# Altium footprint library 691 307 300 0xx.PcbLib: 23 footprints (part 1 of 2)
Each footprint in its own frame and in the unit in brackets; x right, y up, seen from the top. Pads: shape width x height; smd on the part's side, far side on the other; paste and mask are expansions set on the pad; w line width, h text height; cw(c..) or ccw(c..) is an arc to the next point about the centre after c.
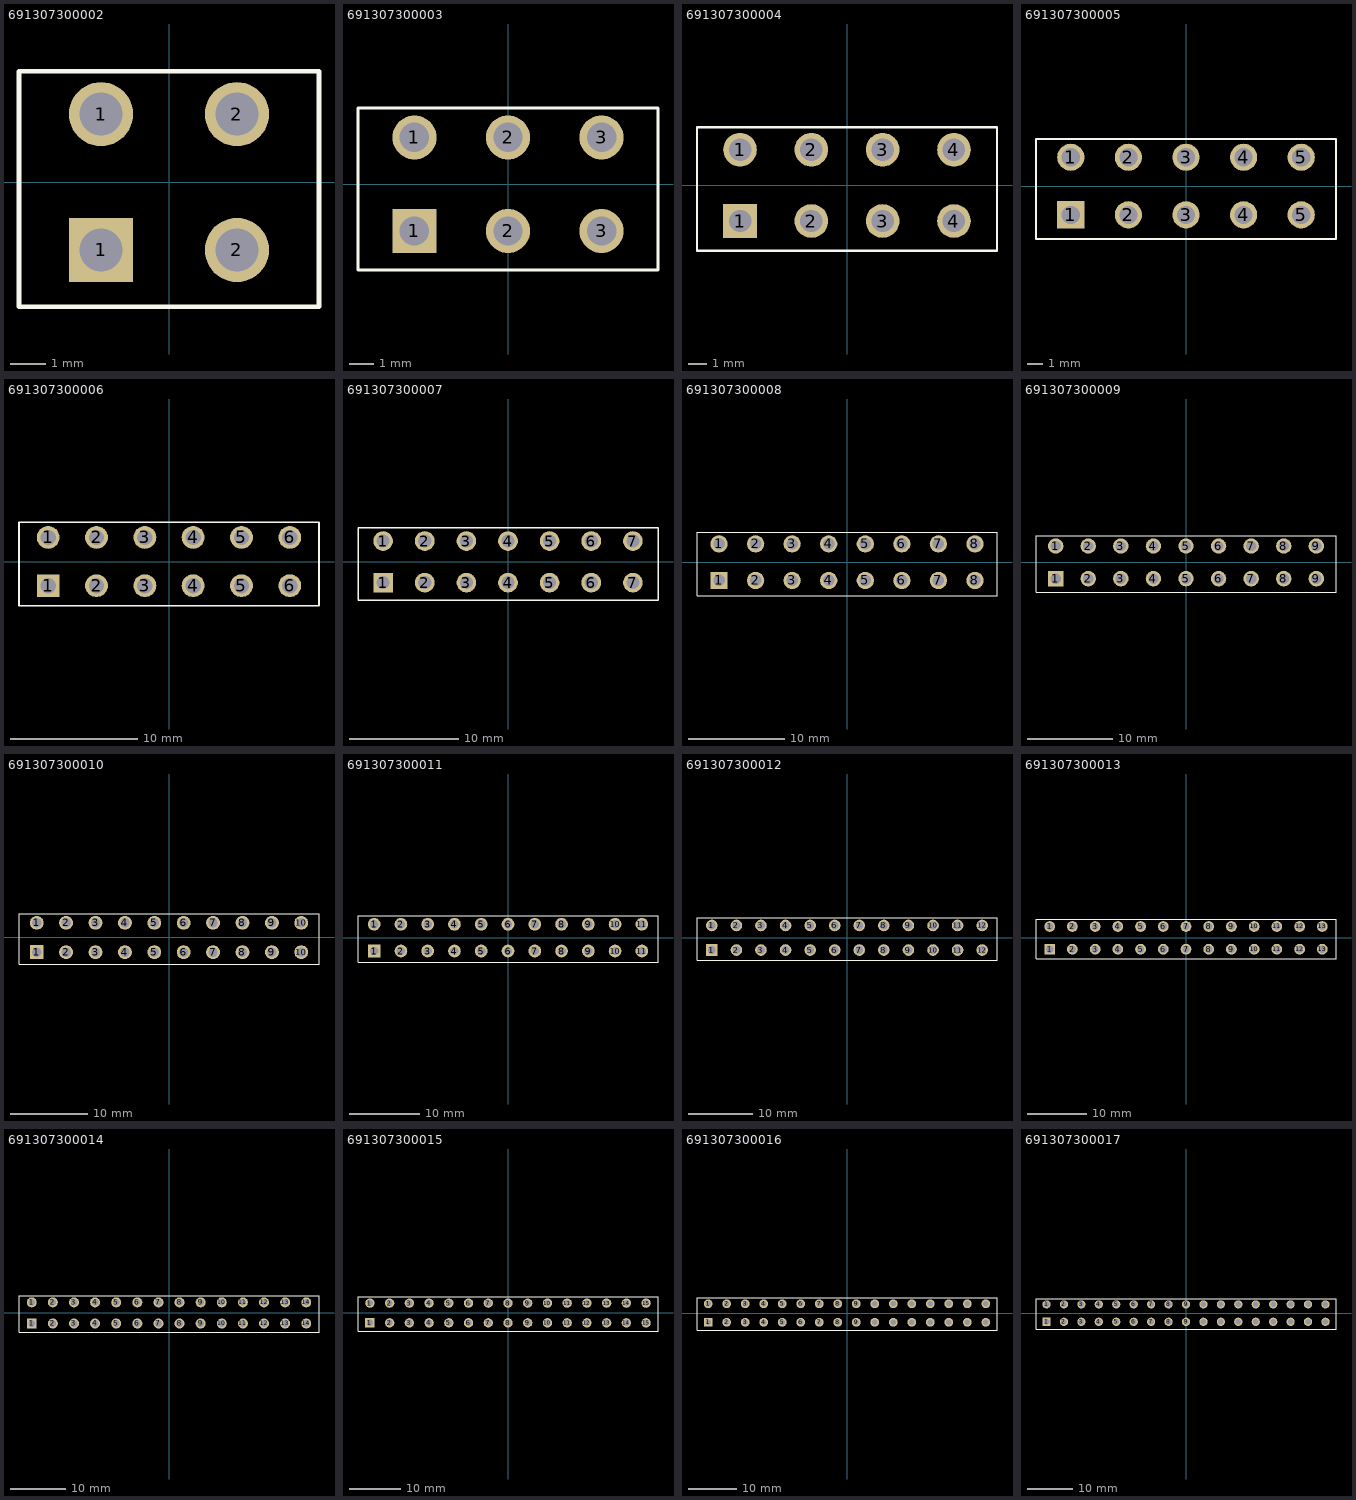
[diagram p0: the footprints below, top view; thin cyan lines are the x and y axes]

## 691307300002 [mm] "Serie 3073 - 3.81 mm _ 2 pins"
height 14.5
pads (4):
  rect 1.8x1.8 hole 1.2: 1(-1.905,-1.905)
  round 1.8 hole 1.2: 1(-1.905,1.905) 2(1.905,-1.905) 2(1.905,1.905)
Top Overlay:
  lines w0.127: -4.205,-3.495 -4.205,3.105 4.205,3.105 4.205,-3.495 -4.205,-3.495
3D body: height 14.55, standoff -3.35, extent -4.205,-3.6 4.205,3.2

## 691307300003 [mm] "Serie 3073 - 3.81 mm _ 3 pins"
height 14.5
pads (6):
  rect 1.8x1.8 hole 1.2: 1(-3.81,-1.905)
  round 1.8 hole 1.2: 1(-3.81,1.905) 2(0,-1.905) 2(0,1.905) 3(3.81,-1.905) 3(3.81,1.905)
Top Overlay:
  lines w0.127: -6.11,-3.495 -6.11,3.105 6.11,3.105 6.11,-3.495 -6.11,-3.495
3D body: height 14.55, standoff -3.35, extent -6.11,-3.6 6.11,3.2

## 691307300004 [mm] "Serie 3073 - 3.81 mm _ 4 pins"
height 14.5
pads (8):
  rect 1.8x1.8 hole 1.2: 1(-5.715,-1.905)
  round 1.8 hole 1.2: 1(-5.715,1.905) 2(-1.905,-1.905) 2(-1.905,1.905) 3(1.905,-1.905) 3(1.905,1.905) 4(5.715,-1.905) 4(5.715,1.905)
Top Overlay:
  lines w0.127: -8.015,-3.495 -8.015,3.105 8.015,3.105 8.015,-3.495 -8.015,-3.495
3D body: height 14.55, standoff -3.35, extent -8.015,-3.6 8.015,3.2

## 691307300005 [mm] "Serie 3073 - 3.81 mm _ 5 pins"
height 14.5
pads (10):
  rect 1.8x1.8 hole 1.2: 1(-7.62,-1.905)
  round 1.8 hole 1.2: 1(-7.62,1.905) 2(-3.81,-1.905) 2(-3.81,1.905) 3(0,-1.905) 3(0,1.905) 4(3.81,-1.905) 4(3.81,1.905) 5(7.62,-1.905) 5(7.62,1.905)
Top Overlay:
  lines w0.127: -9.92,-3.495 9.92,-3.495 9.92,3.105 -9.92,3.105 -9.92,-3.495
3D body: height 14.55, standoff -3.35, extent -9.87,-3.5 9.97,3.3

## 691307300006 [mm] "Serie 3073 - 3.81 mm _ 6 pins"
height 14.5
pads (12):
  rect 1.8x1.8 hole 1.2: 1(-9.525,-1.905)
  round 1.8 hole 1.2: 1(-9.525,1.905) 2(-5.715,-1.905) 2(-5.715,1.905) 3(-1.905,-1.905) 3(-1.905,1.905) 4(1.905,-1.905) 4(1.905,1.905) 5(5.715,-1.905) 5(5.715,1.905) 6(9.525,-1.905) 6(9.525,1.905)
Top Overlay:
  lines w0.127: -11.825,-3.495 11.825,-3.495 11.825,3.105 -11.825,3.105 -11.825,-3.495
3D body: height 14.55, standoff -3.35, extent -11.825,-3.6 11.825,3.2

## 691307300007 [mm] "Serie 3073 - 3.81 mm _ 7 pins"
height 14.5
pads (14):
  rect 1.8x1.8 hole 1.2: 1(-11.43,-1.905)
  round 1.8 hole 1.2: 1(-11.43,1.905) 2(-7.62,-1.905) 2(-7.62,1.905) 3(-3.81,-1.905) 3(-3.81,1.905) 4(0,-1.905) 4(0,1.905) 5(3.81,-1.905) 5(3.81,1.905) 6(7.62,-1.905) 6(7.62,1.905) 7(11.43,-1.905) 7(11.43,1.905)
Top Overlay:
  lines w0.127: -13.73,-3.495 13.73,-3.495 13.73,3.105 -13.73,3.105 -13.73,-3.495
3D body: height 14.55, standoff -3.35, extent -13.7,-3.6 13.76,3.2

## 691307300008 [mm] "Serie 3073 - 3.81 mm _ 8 pins"
height 14.5
pads (16):
  rect 1.8x1.8 hole 1.2: 1(-13.335,-1.905)
  round 1.8 hole 1.2: 1(-13.335,1.905) 2(-9.525,-1.905) 2(-9.525,1.905) 3(-5.715,-1.905) 3(-5.715,1.905) 4(-1.905,-1.905) 4(-1.905,1.905) 5(1.905,-1.905) 5(1.905,1.905) 6(5.715,-1.905) 6(5.715,1.905) 7(9.525,-1.905) 7(9.525,1.905) 8(13.335,-1.905) 8(13.335,1.905)
Top Overlay:
  lines w0.127: -15.635,-3.495 -15.635,3.105 15.635,3.105 15.635,-3.495 -15.635,-3.495
3D body: height 14.55, standoff -3.35, extent -15.635,-3.6 15.635,3.2

## 691307300009 [mm] "Serie 3073 - 3.81 mm _ 9 pins"
height 14.5
pads (18):
  rect 1.8x1.8 hole 1.2: 1(-15.24,-1.905)
  round 1.8 hole 1.2: 1(-15.24,1.905) 2(-11.43,-1.905) 2(-11.43,1.905) 3(-7.62,-1.905) 3(-7.62,1.905) 4(-3.81,-1.905) 4(-3.81,1.905) 5(0,-1.905) 5(0,1.905) 6(3.81,-1.905) 6(3.81,1.905) 7(7.62,-1.905) 7(7.62,1.905) 8(11.43,-1.905) 8(11.43,1.905) 9(15.24,-1.905) 9(15.24,1.905)
Top Overlay:
  lines w0.127: -17.54,-3.495 -17.54,3.105 17.54,3.105 17.54,-3.495 -17.54,-3.495
3D body: height 14.55, standoff -3.35, extent -17.54,-3.5 17.54,3.3

## 691307300010 [mm] "Serie 3073 - 3.81 mm _ 10 pins"
height 14.5
pads (20):
  rect 1.8x1.8 hole 1.2: 1(-17.145,-1.905)
  round 1.8 hole 1.2: 1(-17.145,1.905) 2(-13.335,-1.905) 2(-13.335,1.905) 3(-9.525,-1.905) 3(-9.525,1.905) 4(-5.715,-1.905) 4(-5.715,1.905) 5(-1.905,-1.905) 5(-1.905,1.905) 6(1.905,-1.905) 6(1.905,1.905) 7(5.715,-1.905) 7(5.715,1.905) 8(9.525,-1.905) 8(9.525,1.905) 9(13.335,-1.905) 9(13.335,1.905) 10(17.145,-1.905) 10(17.145,1.905)
Top Overlay:
  lines w0.127: -19.445,-3.495 -19.445,3.105 19.445,3.105 19.445,-3.495 -19.445,-3.495
3D body: height 14.55, standoff -3.35, extent -19.4,-3.5 19.49,3.3

## 691307300011 [mm] "Serie 3073 - 3.81 mm _ 11 pins"
height 14.5
pads (22):
  rect 1.8x1.8 hole 1.2: 1(-19.05,-1.905)
  round 1.8 hole 1.2: 1(-19.05,1.905) 2(-15.24,-1.905) 2(-15.24,1.905) 3(-11.43,-1.905) 3(-11.43,1.905) 4(-7.62,-1.905) 4(-7.62,1.905) 5(-3.81,-1.905) 5(-3.81,1.905) 6(0,-1.905) 6(0,1.905) 7(3.81,-1.905) 7(3.81,1.905) 8(7.62,-1.905) 8(7.62,1.905) 9(11.43,-1.905) 9(11.43,1.905) 10(15.24,-1.905) 10(15.24,1.905) 11(19.05,-1.905) 11(19.05,1.905)
Top Overlay:
  lines w0.127: -21.35,-3.495 -21.35,3.105 21.35,3.105 21.35,-3.495 -21.35,-3.495
3D body: height 14.55, standoff -3.35, extent -21.3,-3.5 21.4,3.3

## 691307300012 [mm] "Serie 3073 - 3.81 mm _ 12 pins"
height 14.5
pads (24):
  rect 1.8x1.8 hole 1.2: 1(-20.955,-1.905)
  round 1.8 hole 1.2: 1(-20.955,1.905) 2(-17.145,-1.905) 2(-17.145,1.905) 3(-13.335,-1.905) 3(-13.335,1.905) 4(-9.525,-1.905) 4(-9.525,1.905) 5(-5.715,-1.905) 5(-5.715,1.905) 6(-1.905,-1.905) 6(-1.905,1.905) 7(1.905,-1.905) 7(1.905,1.905) 8(5.715,-1.905) 8(5.715,1.905) 9(9.525,-1.905) 9(9.525,1.905) 10(13.335,-1.905) 10(13.335,1.905) 11(17.145,-1.905) 11(17.145,1.905) 12(20.955,-1.905) 12(20.955,1.905)
Top Overlay:
  lines w0.127: -23.255,-3.495 -23.255,3.105 23.255,3.105 23.255,-3.495 -23.255,-3.495
3D body: height 14.55, standoff -3.35, extent -23.2,-3.5 23.31,3.3

## 691307300013 [mm] "Serie 3073 - 3.81 mm _ 13 pins"
height 14.5
pads (26):
  rect 1.8x1.8 hole 1.2: 1(-22.86,-1.905)
  round 1.8 hole 1.2: 1(-22.86,1.905) 2(-19.05,-1.905) 2(-19.05,1.905) 3(-15.24,-1.905) 3(-15.24,1.905) 4(-11.43,-1.905) 4(-11.43,1.905) 5(-7.62,-1.905) 5(-7.62,1.905) 6(-3.81,-1.905) 6(-3.81,1.905) 7(0,-1.905) 7(0,1.905) 8(3.81,-1.905) 8(3.81,1.905) 9(7.62,-1.905) 9(7.62,1.905) 10(11.43,-1.905) 10(11.43,1.905) 11(15.24,-1.905) 11(15.24,1.905) 12(19.05,-1.905) 12(19.05,1.905) 13(22.86,-1.905) 13(22.86,1.905)
Top Overlay:
  lines w0.127: -25.16,-3.495 -25.16,3.105 25.16,3.105 25.16,-3.495 -25.16,-3.495
3D body: height 14.55, standoff -3.35, extent -25.2,-3.5 25.12,3.3

## 691307300014 [mm] "Serie 3073 - 3.81 mm _ 14 pins"
height 14.5
pads (28):
  rect 1.8x1.8 hole 1.2: 1(-24.765,-1.905)
  round 1.8 hole 1.2: 1(-24.765,1.905) 2(-20.955,-1.905) 2(-20.955,1.905) 3(-17.145,-1.905) 3(-17.145,1.905) 4(-13.335,-1.905) 4(-13.335,1.905) 5(-9.525,-1.905) 5(-9.525,1.905) 6(-5.715,-1.905) 6(-5.715,1.905) 7(-1.905,-1.905) 7(-1.905,1.905) 8(1.905,-1.905) 8(1.905,1.905) 9(5.715,-1.905) 9(5.715,1.905) 10(9.525,-1.905) 10(9.525,1.905) 11(13.335,-1.905) 11(13.335,1.905) 12(17.145,-1.905) 12(17.145,1.905) 13(20.955,-1.905) 13(20.955,1.905) 14(24.765,-1.905) 14(24.765,1.905)
Top Overlay:
  lines w0.127: -27.065,-3.495 -27.065,3.105 27.065,3.105 27.065,-3.495 -27.065,-3.495
3D body: height 14.55, standoff -3.35, extent -27.065,-3.5 27.065,3.3

## 691307300015 [mm] "Serie 3073 - 3.81 mm _ 15 pins"
height 14.5
pads (30):
  rect 1.8x1.8 hole 1.2: 1(-26.67,-1.905)
  round 1.8 hole 1.2: 1(-26.67,1.905) 2(-22.86,-1.905) 2(-22.86,1.905) 3(-19.05,-1.905) 3(-19.05,1.905) 4(-15.24,-1.905) 4(-15.24,1.905) 5(-11.43,-1.905) 5(-11.43,1.905) 6(-7.62,-1.905) 6(-7.62,1.905) 7(-3.81,-1.905) 7(-3.81,1.905) 8(0,-1.905) 8(0,1.905) 9(3.81,-1.905) 9(3.81,1.905) 10(7.62,-1.905) 10(7.62,1.905) 11(11.43,-1.905) 11(11.43,1.905) 12(15.24,-1.905) 12(15.24,1.905) 13(19.05,-1.905) 13(19.05,1.905) 14(22.86,-1.905) 14(22.86,1.905) 15(26.67,-1.905) 15(26.67,1.905)
Top Overlay:
  lines w0.127: -28.97,-3.495 28.97,-3.495 28.97,3.105 -28.97,3.105 -28.97,-3.495
3D body: height 14.55, standoff -3.35, extent -28.97,-3.5 28.97,3.3

## 691307300016 [mm] "Serie 3073 - 3.81 mm _ 16 pins"
height 14.5
pads (32):
  rect 1.8x1.8 hole 1.2: 1(-28.575,-1.905)
  round 1.8 hole 1.2: 1(-28.575,1.905) 2(-24.765,-1.905) 2(-24.765,1.905) 3(-20.955,-1.905) 3(-20.955,1.905) 4(-17.145,-1.905) 4(-17.145,1.905) 5(-13.335,-1.905) 5(-13.335,1.905) 6(-9.525,-1.905) 6(-9.525,1.905) 7(-5.715,-1.905) 7(-5.715,1.905) 8(-1.905,-1.905) 8(-1.905,1.905) 9(1.905,-1.905) 9(1.905,1.905) 10(5.715,-1.905) 10(5.715,1.905) 11(9.525,-1.905) 11(9.525,1.905) 12(13.335,-1.905) 12(13.335,1.905) 13(17.145,-1.905) 13(17.145,1.905) 14(20.955,-1.905) 14(20.955,1.905) 15(24.765,-1.905) 15(24.765,1.905) 16(28.575,-1.905) 16(28.575,1.905)
Top Overlay:
  lines w0.127: -30.875,-3.495 -30.875,3.105 30.875,3.105 30.875,-3.495 -30.875,-3.495
3D body: height 14.55, standoff -3.35, extent -30.875,-3.5 30.875,3.3

## 691307300017 [mm] "Serie 3073 - 3.81 mm _ 17 pins"
height 14.5
pads (34):
  rect 1.8x1.8 hole 1.2: 1(-30.48,-1.905)
  round 1.8 hole 1.2: 1(-30.48,1.905) 2(-26.67,-1.905) 2(-26.67,1.905) 3(-22.86,-1.905) 3(-22.86,1.905) 4(-19.05,-1.905) 4(-19.05,1.905) 5(-15.24,-1.905) 5(-15.24,1.905) 6(-11.43,-1.905) 6(-11.43,1.905) 7(-7.62,-1.905) 7(-7.62,1.905) 8(-3.81,-1.905) 8(-3.81,1.905) 9(0,-1.905) 9(0,1.905) 10(3.81,-1.905) 10(3.81,1.905) 11(7.62,-1.905) 11(7.62,1.905) 12(11.43,-1.905) 12(11.43,1.905) 13(15.24,-1.905) 13(15.24,1.905) 14(19.05,-1.905) 14(19.05,1.905) 15(22.86,-1.905) 15(22.86,1.905) 16(26.67,-1.905) 16(26.67,1.905) 17(30.48,-1.905) 17(30.48,1.905)
Top Overlay:
  lines w0.127: -32.78,-3.495 -32.78,3.105 32.78,3.105 32.78,-3.495 -32.78,-3.495
3D body: height 14.55, standoff -3.35, extent -32.78,-3.5 32.78,3.3